# Altium schematic symbol library Wurth_Elektronik_Passive_rev16a.SCHLIB: 1143 symbols (part 13 of 27)
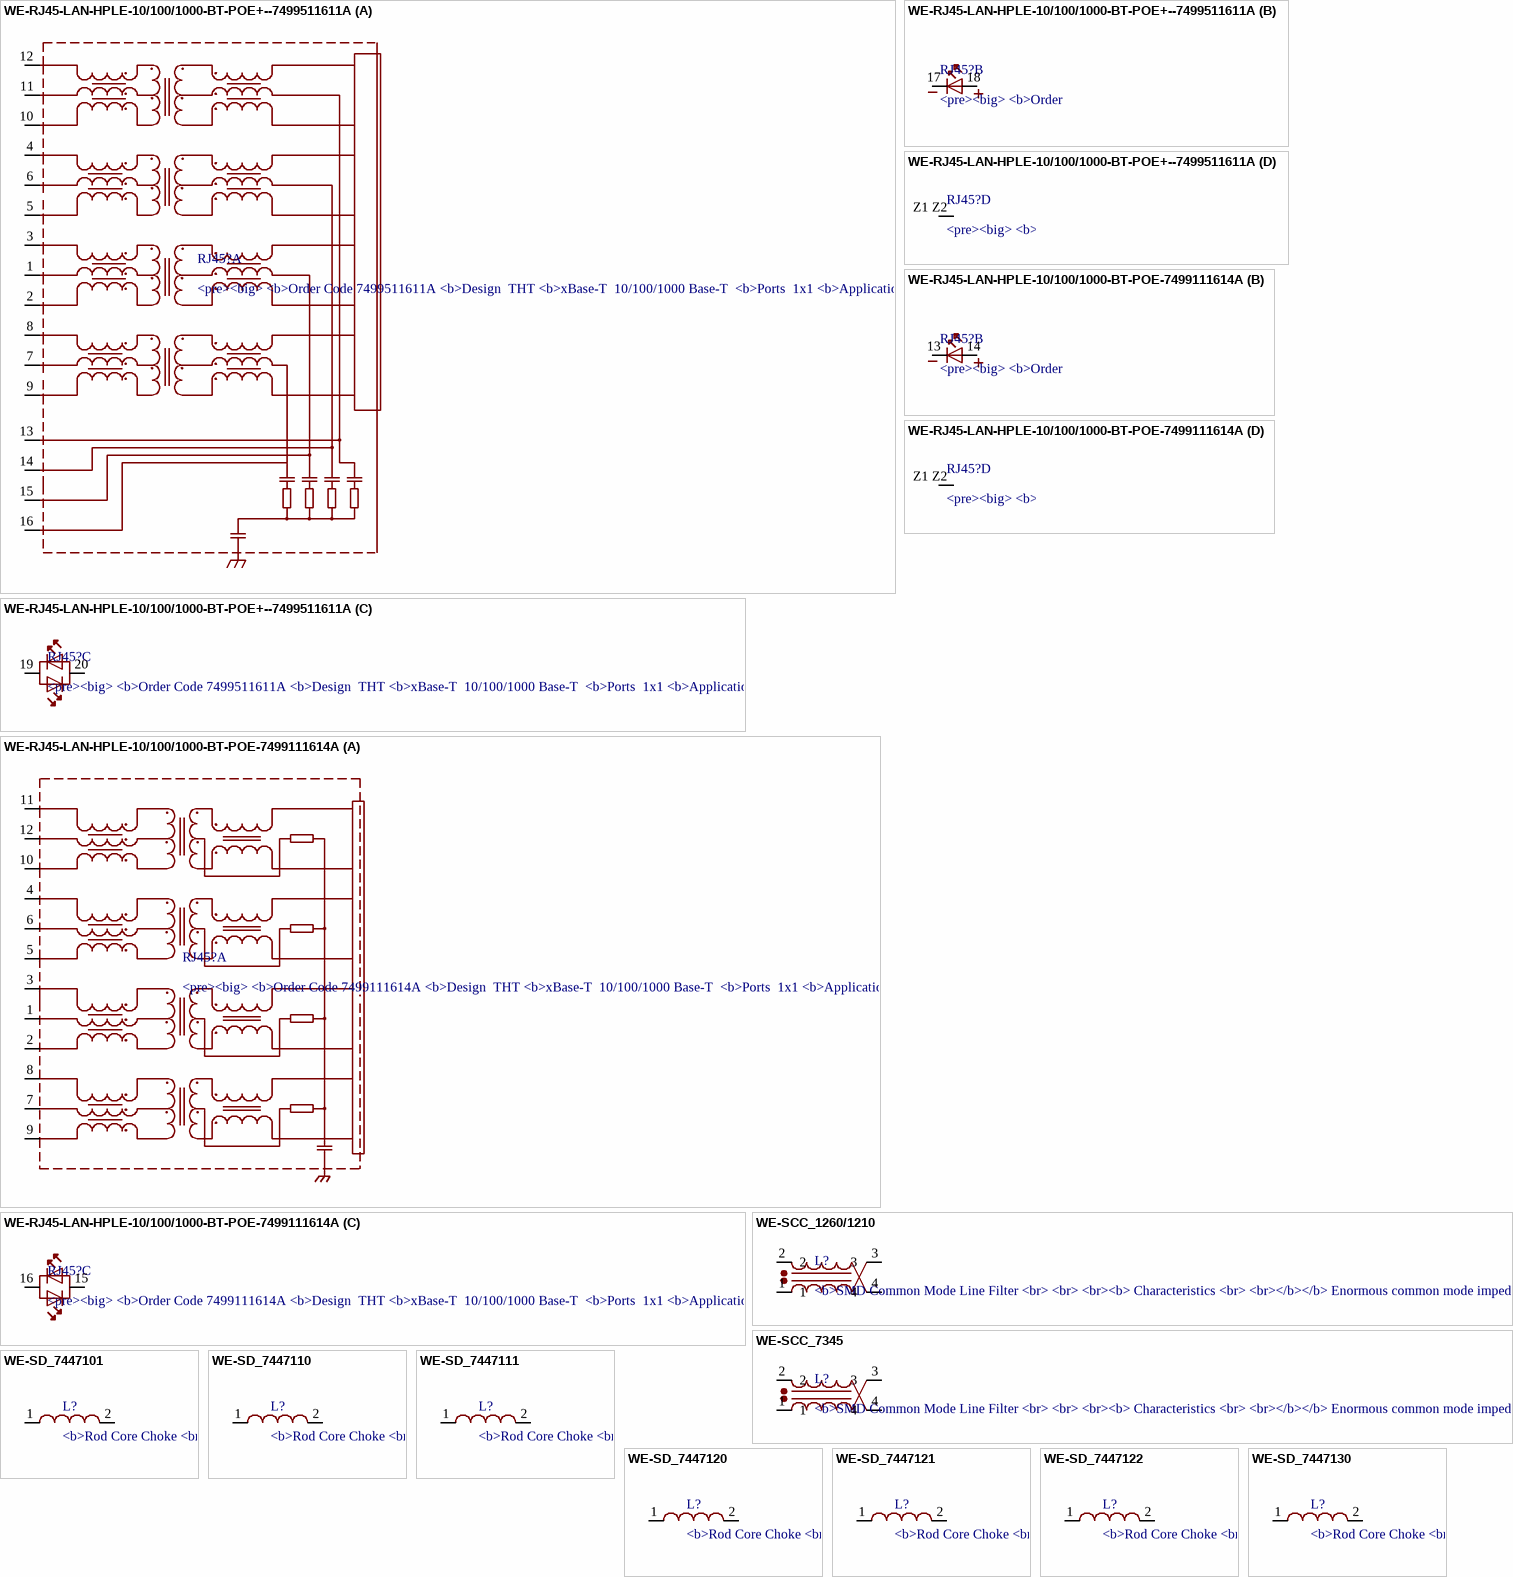
[diagram p70: symbols WE-RJ45-LAN-HPLE-10/100/1000-BT-POE+--7499511611A to WE-SD_7447130]

## WE-SD_7447101
designator L?, comment <b>Rod Core Choke / <br> / <br> / <br><b> Characteristics / <br> / <br></b></b> Rated current up to 15 A / <br> / <br> Inductance is independent from rated DC current / <br> / <br> High mechanical stability / <br> / <br> High saturation currents / <br> / <br> Operating temperature: –40 ºC to +150 ºC / <br> / <br> Custom designs on request / <br> / <br> / <br><b> Applications / <br> / <br></b> Switching regulators / <br> / <br> / <br> Motors / <br> / <br> Power amplifiers / <br> / <br> Power supplies / <br> / <br> Broadband filtering / <br> / <br> Typical in VHF / <br> / <br> / <br> / </b><br><a href=<br><a href="http://katalog.we-online.de/media/images/eisos/IndSD_pf2.jpg" title="Enlarge picture"> / <img src="http://katalog.we-online.de/media/images/eisos/IndSD_pf2.jpg" width="320"></a><p> / Details see: <a href="http://katalog.we-online.de/en/pbs/WE-SD?">http://katalog.we-online.de/en/pbs/WE-SD?</a><p> / </b> / </b>Updated  by  Dan Xu 2014-07-11<br> / </b>2014 (C) Wurth Elektronik
footprint WE-SD_7447101
pins: 1, 2

## WE-SD_7447110
designator L?, comment <b>Rod Core Choke / <br> / <br> / <br><b> Characteristics / <br> / <br></b></b> Rated current up to 15 A / <br> / <br> Inductance is independent from rated DC current / <br> / <br> High mechanical stability / <br> / <br> High saturation currents / <br> / <br> Operating temperature: –40 ºC to +150 ºC / <br> / <br> Custom designs on request / <br> / <br> / <br><b> Applications / <br> / <br></b> Switching regulators / <br> / <br> / <br> Motors / <br> / <br> Power amplifiers / <br> / <br> Power supplies / <br> / <br> Broadband filtering / <br> / <br> Typical in VHF / <br> / <br> / <br> / </b><br><a href=<br><a href="http://katalog.we-online.de/media/images/eisos/IndSD_pf2.jpg" title="Enlarge picture"> / <img src="http://katalog.we-online.de/media/images/eisos/IndSD_pf2.jpg" width="320"></a><p> / Details see: <a href="http://katalog.we-online.de/en/pbs/WE-SD?">http://katalog.we-online.de/en/pbs/WE-SD?</a><p> / </b> / </b>Updated  by  Dan Xu 2014-07-11<br> / </b>2014 (C) Wurth Elektronik
footprint WE-SD_7447110
pins: 1, 2

## WE-SD_7447111
designator L?, comment <b>Rod Core Choke / <br> / <br> / <br><b> Characteristics / <br> / <br></b></b> Rated current up to 15 A / <br> / <br> Inductance is independent from rated DC current / <br> / <br> High mechanical stability / <br> / <br> High saturation currents / <br> / <br> Operating temperature: –40 ºC to +150 ºC / <br> / <br> Custom designs on request / <br> / <br> / <br><b> Applications / <br> / <br></b> Switching regulators / <br> / <br> / <br> Motors / <br> / <br> Power amplifiers / <br> / <br> Power supplies / <br> / <br> Broadband filtering / <br> / <br> Typical in VHF / <br> / <br> / <br> / </b><br><a href=<br><a href="http://katalog.we-online.de/media/images/eisos/IndSD_pf2.jpg" title="Enlarge picture"> / <img src="http://katalog.we-online.de/media/images/eisos/IndSD_pf2.jpg" width="320"></a><p> / Details see: <a href="http://katalog.we-online.de/en/pbs/WE-SD?">http://katalog.we-online.de/en/pbs/WE-SD?</a><p> / </b> / </b>Updated  by  Dan Xu 2014-07-11<br> / </b>2014 (C) Wurth Elektronik
footprint WE-SD_7447111
pins: 1, 2

## WE-SD_7447120
designator L?, comment <b>Rod Core Choke / <br> / <br> / <br><b> Characteristics / <br> / <br></b></b> Rated current up to 15 A / <br> / <br> Inductance is independent from rated DC current / <br> / <br> High mechanical stability / <br> / <br> High saturation currents / <br> / <br> Operating temperature: –40 ºC to +150 ºC / <br> / <br> Custom designs on request / <br> / <br> / <br><b> Applications / <br> / <br></b> Switching regulators / <br> / <br> / <br> Motors / <br> / <br> Power amplifiers / <br> / <br> Power supplies / <br> / <br> Broadband filtering / <br> / <br> Typical in VHF / <br> / <br> / <br> / </b><br><a href=<br><a href="http://katalog.we-online.de/media/images/eisos/IndSD_pf2.jpg" title="Enlarge picture"> / <img src="http://katalog.we-online.de/media/images/eisos/IndSD_pf2.jpg" width="320"></a><p> / Details see: <a href="http://katalog.we-online.de/en/pbs/WE-SD?">http://katalog.we-online.de/en/pbs/WE-SD?</a><p> / </b> / </b>Updated  by  Dan Xu 2014-07-11<br> / </b>2014 (C) Wurth Elektronik
footprint WE-SD_7447120
pins: 1, 2

## WE-SD_7447121
designator L?, comment <b>Rod Core Choke / <br> / <br> / <br><b> Characteristics / <br> / <br></b></b> Rated current up to 15 A / <br> / <br> Inductance is independent from rated DC current / <br> / <br> High mechanical stability / <br> / <br> High saturation currents / <br> / <br> Operating temperature: –40 ºC to +150 ºC / <br> / <br> Custom designs on request / <br> / <br> / <br><b> Applications / <br> / <br></b> Switching regulators / <br> / <br> / <br> Motors / <br> / <br> Power amplifiers / <br> / <br> Power supplies / <br> / <br> Broadband filtering / <br> / <br> Typical in VHF / <br> / <br> / <br> / </b><br><a href=<br><a href="http://katalog.we-online.de/media/images/eisos/IndSD_pf2.jpg" title="Enlarge picture"> / <img src="http://katalog.we-online.de/media/images/eisos/IndSD_pf2.jpg" width="320"></a><p> / Details see: <a href="http://katalog.we-online.de/en/pbs/WE-SD?">http://katalog.we-online.de/en/pbs/WE-SD?</a><p> / </b> / </b>Updated  by  Dan Xu 2014-07-11<br> / </b>2014 (C) Wurth Elektronik
footprint WE-SD_7447121
pins: 1, 2

## WE-SD_7447122
designator L?, comment <b>Rod Core Choke / <br> / <br> / <br><b> Characteristics / <br> / <br></b></b> Rated current up to 15 A / <br> / <br> Inductance is independent from rated DC current / <br> / <br> High mechanical stability / <br> / <br> High saturation currents / <br> / <br> Operating temperature: –40 ºC to +150 ºC / <br> / <br> Custom designs on request / <br> / <br> / <br><b> Applications / <br> / <br></b> Switching regulators / <br> / <br> / <br> Motors / <br> / <br> Power amplifiers / <br> / <br> Power supplies / <br> / <br> Broadband filtering / <br> / <br> Typical in VHF / <br> / <br> / <br> / </b><br><a href=<br><a href="http://katalog.we-online.de/media/images/eisos/IndSD_pf2.jpg" title="Enlarge picture"> / <img src="http://katalog.we-online.de/media/images/eisos/IndSD_pf2.jpg" width="320"></a><p> / Details see: <a href="http://katalog.we-online.de/en/pbs/WE-SD?">http://katalog.we-online.de/en/pbs/WE-SD?</a><p> / </b> / </b>Updated  by  Dan Xu 2014-07-11<br> / </b>2014 (C) Wurth Elektronik
footprint WE-SD_7447122
pins: 1, 2

## WE-SD_7447130
designator L?, comment <b>Rod Core Choke / <br> / <br> / <br><b> Characteristics / <br> / <br></b></b> Rated current up to 15 A / <br> / <br> Inductance is independent from rated DC current / <br> / <br> High mechanical stability / <br> / <br> High saturation currents / <br> / <br> Operating temperature: –40 ºC to +150 ºC / <br> / <br> Custom designs on request / <br> / <br> / <br><b> Applications / <br> / <br></b> Switching regulators / <br> / <br> / <br> Motors / <br> / <br> Power amplifiers / <br> / <br> Power supplies / <br> / <br> Broadband filtering / <br> / <br> Typical in VHF / <br> / <br> / <br> / </b><br><a href=<br><a href="http://katalog.we-online.de/media/images/eisos/IndSD_pf2.jpg" title="Enlarge picture"> / <img src="http://katalog.we-online.de/media/images/eisos/IndSD_pf2.jpg" width="320"></a><p> / Details see: <a href="http://katalog.we-online.de/en/pbs/WE-SD?">http://katalog.we-online.de/en/pbs/WE-SD?</a><p> / </b> / </b>Updated  by  Dan Xu 2014-07-11<br> / </b>2014 (C) Wurth Elektronik
footprint WE-SD_7447130
pins: 1, 2

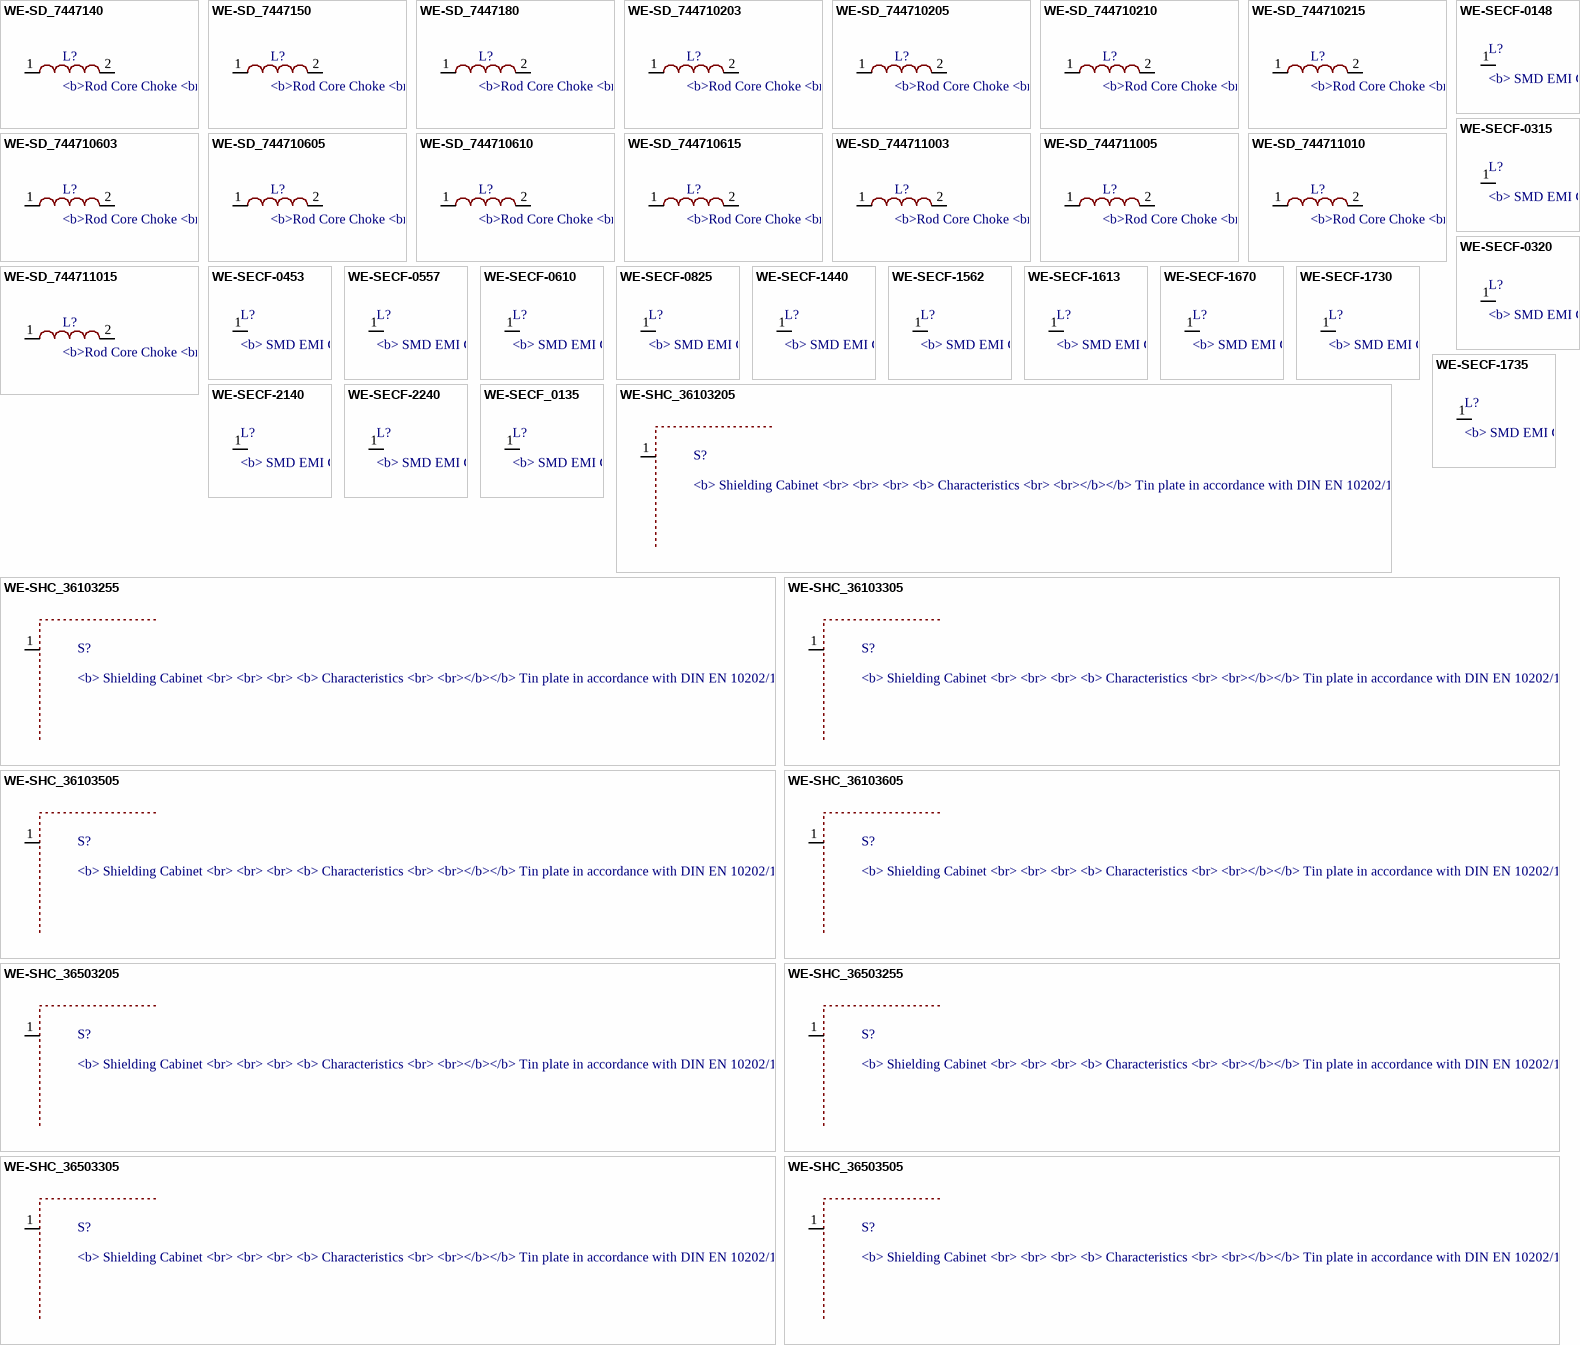
[diagram p42: symbols WE-SD_7447140 to WE-SHC_36503505]

## WE-SD_7447140
designator L?, comment <b>Rod Core Choke / <br> / <br> / <br><b> Characteristics / <br> / <br></b></b> Rated current up to 15 A / <br> / <br> Inductance is independent from rated DC current / <br> / <br> High mechanical stability / <br> / <br> High saturation currents / <br> / <br> Operating temperature: –40 ºC to +150 ºC / <br> / <br> Custom designs on request / <br> / <br> / <br><b> Applications / <br> / <br></b> Switching regulators / <br> / <br> / <br> Motors / <br> / <br> Power amplifiers / <br> / <br> Power supplies / <br> / <br> Broadband filtering / <br> / <br> Typical in VHF / <br> / <br> / <br> / </b><br><a href=<br><a href="http://katalog.we-online.de/media/images/eisos/IndSD_pf2.jpg" title="Enlarge picture"> / <img src="http://katalog.we-online.de/media/images/eisos/IndSD_pf2.jpg" width="320"></a><p> / Details see: <a href="http://katalog.we-online.de/en/pbs/WE-SD?">http://katalog.we-online.de/en/pbs/WE-SD?</a><p> / </b> / </b>Updated  by  Dan Xu 2014-07-11<br> / </b>2014 (C) Wurth Elektronik
footprint WE-SD_7447140
pins: 1, 2

## WE-SD_7447150
designator L?, comment <b>Rod Core Choke / <br> / <br> / <br><b> Characteristics / <br> / <br></b></b> Rated current up to 15 A / <br> / <br> Inductance is independent from rated DC current / <br> / <br> High mechanical stability / <br> / <br> High saturation currents / <br> / <br> Operating temperature: –40 ºC to +150 ºC / <br> / <br> Custom designs on request / <br> / <br> / <br><b> Applications / <br> / <br></b> Switching regulators / <br> / <br> / <br> Motors / <br> / <br> Power amplifiers / <br> / <br> Power supplies / <br> / <br> Broadband filtering / <br> / <br> Typical in VHF / <br> / <br> / <br> / </b><br><a href=<br><a href="http://katalog.we-online.de/media/images/eisos/IndSD_pf2.jpg" title="Enlarge picture"> / <img src="http://katalog.we-online.de/media/images/eisos/IndSD_pf2.jpg" width="320"></a><p> / Details see: <a href="http://katalog.we-online.de/en/pbs/WE-SD?">http://katalog.we-online.de/en/pbs/WE-SD?</a><p> / </b> / </b>Updated  by  Dan Xu 2014-07-11<br> / </b>2014 (C) Wurth Elektronik
footprint WE-SD_7447150
pins: 1, 2

## WE-SD_7447180
designator L?, comment <b>Rod Core Choke / <br> / <br> / <br><b> Characteristics / <br> / <br></b></b> Rated current up to 15 A / <br> / <br> Inductance is independent from rated DC current / <br> / <br> High mechanical stability / <br> / <br> High saturation currents / <br> / <br> Operating temperature: –40 ºC to +150 ºC / <br> / <br> Custom designs on request / <br> / <br> / <br><b> Applications / <br> / <br></b> Switching regulators / <br> / <br> / <br> Motors / <br> / <br> Power amplifiers / <br> / <br> Power supplies / <br> / <br> Broadband filtering / <br> / <br> Typical in VHF / <br> / <br> / <br> / </b><br><a href=<br><a href="http://katalog.we-online.de/media/images/eisos/IndSD_pf2.jpg" title="Enlarge picture"> / <img src="http://katalog.we-online.de/media/images/eisos/IndSD_pf2.jpg" width="320"></a><p> / Details see: <a href="http://katalog.we-online.de/en/pbs/WE-SD?">http://katalog.we-online.de/en/pbs/WE-SD?</a><p> / </b> / </b>Updated  by  Dan Xu 2014-07-11<br> / </b>2014 (C) Wurth Elektronik
footprint WE-SD_7447180
pins: 1, 2

## WE-SD_744710203
designator L?, comment <b>Rod Core Choke / <br> / <br> / <br><b> Characteristics / <br> / <br></b></b> Rated current up to 15 A / <br> / <br> Inductance is independent from rated DC current / <br> / <br> High mechanical stability / <br> / <br> High saturation currents / <br> / <br> Operating temperature: –40 ºC to +150 ºC / <br> / <br> Custom designs on request / <br> / <br> / <br><b> Applications / <br> / <br></b> Switching regulators / <br> / <br> / <br> Motors / <br> / <br> Power amplifiers / <br> / <br> Power supplies / <br> / <br> Broadband filtering / <br> / <br> Typical in VHF / <br> / <br> / <br> / </b><br><a href=<br><a href="http://katalog.we-online.de/media/images/eisos/IndSD_pf2.jpg" title="Enlarge picture"> / <img src="http://katalog.we-online.de/media/images/eisos/IndSD_pf2.jpg" width="320"></a><p> / Details see: <a href="http://katalog.we-online.de/en/pbs/WE-SD?">http://katalog.we-online.de/en/pbs/WE-SD?</a><p> / </b> / </b>Updated  by  Dan Xu 2014-07-11<br> / </b>2014 (C) Wurth Elektronik
footprint WE-SD_744710203
pins: 1, 2

## WE-SD_744710205
designator L?, comment <b>Rod Core Choke / <br> / <br> / <br><b> Characteristics / <br> / <br></b></b> Rated current up to 15 A / <br> / <br> Inductance is independent from rated DC current / <br> / <br> High mechanical stability / <br> / <br> High saturation currents / <br> / <br> Operating temperature: –40 ºC to +150 ºC / <br> / <br> Custom designs on request / <br> / <br> / <br><b> Applications / <br> / <br></b> Switching regulators / <br> / <br> / <br> Motors / <br> / <br> Power amplifiers / <br> / <br> Power supplies / <br> / <br> Broadband filtering / <br> / <br> Typical in VHF / <br> / <br> / <br> / </b><br><a href=<br><a href="http://katalog.we-online.de/media/images/eisos/IndSD_pf2.jpg" title="Enlarge picture"> / <img src="http://katalog.we-online.de/media/images/eisos/IndSD_pf2.jpg" width="320"></a><p> / Details see: <a href="http://katalog.we-online.de/en/pbs/WE-SD?">http://katalog.we-online.de/en/pbs/WE-SD?</a><p> / </b> / </b>Updated  by  Dan Xu 2014-07-11<br> / </b>2014 (C) Wurth Elektronik
footprint WE-SD_744710205
pins: 1, 2

## WE-SD_744710210
designator L?, comment <b>Rod Core Choke / <br> / <br> / <br><b> Characteristics / <br> / <br></b></b> Rated current up to 15 A / <br> / <br> Inductance is independent from rated DC current / <br> / <br> High mechanical stability / <br> / <br> High saturation currents / <br> / <br> Operating temperature: –40 ºC to +150 ºC / <br> / <br> Custom designs on request / <br> / <br> / <br><b> Applications / <br> / <br></b> Switching regulators / <br> / <br> / <br> Motors / <br> / <br> Power amplifiers / <br> / <br> Power supplies / <br> / <br> Broadband filtering / <br> / <br> Typical in VHF / <br> / <br> / <br> / </b><br><a href=<br><a href="http://katalog.we-online.de/media/images/eisos/IndSD_pf2.jpg" title="Enlarge picture"> / <img src="http://katalog.we-online.de/media/images/eisos/IndSD_pf2.jpg" width="320"></a><p> / Details see: <a href="http://katalog.we-online.de/en/pbs/WE-SD?">http://katalog.we-online.de/en/pbs/WE-SD?</a><p> / </b> / </b>Updated  by  Dan Xu 2014-07-11<br> / </b>2014 (C) Wurth Elektronik
footprint WE-SD_744710210
pins: 1, 2

## WE-SD_744710215
designator L?, comment <b>Rod Core Choke / <br> / <br> / <br><b> Characteristics / <br> / <br></b></b> Rated current up to 15 A / <br> / <br> Inductance is independent from rated DC current / <br> / <br> High mechanical stability / <br> / <br> High saturation currents / <br> / <br> Operating temperature: –40 ºC to +150 ºC / <br> / <br> Custom designs on request / <br> / <br> / <br><b> Applications / <br> / <br></b> Switching regulators / <br> / <br> / <br> Motors / <br> / <br> Power amplifiers / <br> / <br> Power supplies / <br> / <br> Broadband filtering / <br> / <br> Typical in VHF / <br> / <br> / <br> / </b><br><a href=<br><a href="http://katalog.we-online.de/media/images/eisos/IndSD_pf2.jpg" title="Enlarge picture"> / <img src="http://katalog.we-online.de/media/images/eisos/IndSD_pf2.jpg" width="320"></a><p> / Details see: <a href="http://katalog.we-online.de/en/pbs/WE-SD?">http://katalog.we-online.de/en/pbs/WE-SD?</a><p> / </b> / </b>Updated  by  Dan Xu 2014-07-11<br> / </b>2014 (C) Wurth Elektronik
footprint WE-SD_744710215
pins: 1, 2

## WE-SD_744710603
designator L?, comment <b>Rod Core Choke / <br> / <br> / <br><b> Characteristics / <br> / <br></b></b> Rated current up to 15 A / <br> / <br> Inductance is independent from rated DC current / <br> / <br> High mechanical stability / <br> / <br> High saturation currents / <br> / <br> Operating temperature: –40 ºC to +150 ºC / <br> / <br> Custom designs on request / <br> / <br> / <br><b> Applications / <br> / <br></b> Switching regulators / <br> / <br> / <br> Motors / <br> / <br> Power amplifiers / <br> / <br> Power supplies / <br> / <br> Broadband filtering / <br> / <br> Typical in VHF / <br> / <br> / <br> / </b><br><a href=<br><a href="http://katalog.we-online.de/media/images/eisos/IndSD_pf2.jpg" title="Enlarge picture"> / <img src="http://katalog.we-online.de/media/images/eisos/IndSD_pf2.jpg" width="320"></a><p> / Details see: <a href="http://katalog.we-online.de/en/pbs/WE-SD?">http://katalog.we-online.de/en/pbs/WE-SD?</a><p> / </b> / </b>Updated  by  Dan Xu 2014-07-11<br> / </b>2014 (C) Wurth Elektronik
footprint WE-SD_744710603
pins: 1, 2

## WE-SD_744710605
designator L?, comment <b>Rod Core Choke / <br> / <br> / <br><b> Characteristics / <br> / <br></b></b> Rated current up to 15 A / <br> / <br> Inductance is independent from rated DC current / <br> / <br> High mechanical stability / <br> / <br> High saturation currents / <br> / <br> Operating temperature: –40 ºC to +150 ºC / <br> / <br> Custom designs on request / <br> / <br> / <br><b> Applications / <br> / <br></b> Switching regulators / <br> / <br> / <br> Motors / <br> / <br> Power amplifiers / <br> / <br> Power supplies / <br> / <br> Broadband filtering / <br> / <br> Typical in VHF / <br> / <br> / <br> / </b><br><a href=<br><a href="http://katalog.we-online.de/media/images/eisos/IndSD_pf2.jpg" title="Enlarge picture"> / <img src="http://katalog.we-online.de/media/images/eisos/IndSD_pf2.jpg" width="320"></a><p> / Details see: <a href="http://katalog.we-online.de/en/pbs/WE-SD?">http://katalog.we-online.de/en/pbs/WE-SD?</a><p> / </b> / </b>Updated  by  Dan Xu 2014-07-11<br> / </b>2014 (C) Wurth Elektronik
footprint WE-SD_744710605
pins: 1, 2

## WE-SD_744710610
designator L?, comment <b>Rod Core Choke / <br> / <br> / <br><b> Characteristics / <br> / <br></b></b> Rated current up to 15 A / <br> / <br> Inductance is independent from rated DC current / <br> / <br> High mechanical stability / <br> / <br> High saturation currents / <br> / <br> Operating temperature: –40 ºC to +150 ºC / <br> / <br> Custom designs on request / <br> / <br> / <br><b> Applications / <br> / <br></b> Switching regulators / <br> / <br> / <br> Motors / <br> / <br> Power amplifiers / <br> / <br> Power supplies / <br> / <br> Broadband filtering / <br> / <br> Typical in VHF / <br> / <br> / <br> / </b><br><a href=<br><a href="http://katalog.we-online.de/media/images/eisos/IndSD_pf2.jpg" title="Enlarge picture"> / <img src="http://katalog.we-online.de/media/images/eisos/IndSD_pf2.jpg" width="320"></a><p> / Details see: <a href="http://katalog.we-online.de/en/pbs/WE-SD?">http://katalog.we-online.de/en/pbs/WE-SD?</a><p> / </b> / </b>Updated  by  Dan Xu 2014-07-11<br> / </b>2014 (C) Wurth Elektronik
footprint WE-SD_744710610
pins: 1, 2

## WE-SD_744710615
designator L?, comment <b>Rod Core Choke / <br> / <br> / <br><b> Characteristics / <br> / <br></b></b> Rated current up to 15 A / <br> / <br> Inductance is independent from rated DC current / <br> / <br> High mechanical stability / <br> / <br> High saturation currents / <br> / <br> Operating temperature: –40 ºC to +150 ºC / <br> / <br> Custom designs on request / <br> / <br> / <br><b> Applications / <br> / <br></b> Switching regulators / <br> / <br> / <br> Motors / <br> / <br> Power amplifiers / <br> / <br> Power supplies / <br> / <br> Broadband filtering / <br> / <br> Typical in VHF / <br> / <br> / <br> / </b><br><a href=<br><a href="http://katalog.we-online.de/media/images/eisos/IndSD_pf2.jpg" title="Enlarge picture"> / <img src="http://katalog.we-online.de/media/images/eisos/IndSD_pf2.jpg" width="320"></a><p> / Details see: <a href="http://katalog.we-online.de/en/pbs/WE-SD?">http://katalog.we-online.de/en/pbs/WE-SD?</a><p> / </b> / </b>Updated  by  Dan Xu 2014-07-11<br> / </b>2014 (C) Wurth Elektronik
footprint WE-SD_744710615
pins: 1, 2

## WE-SD_744711003
designator L?, comment <b>Rod Core Choke / <br> / <br> / <br><b> Characteristics / <br> / <br></b></b> Rated current up to 15 A / <br> / <br> Inductance is independent from rated DC current / <br> / <br> High mechanical stability / <br> / <br> High saturation currents / <br> / <br> Operating temperature: –40 ºC to +150 ºC / <br> / <br> Custom designs on request / <br> / <br> / <br><b> Applications / <br> / <br></b> Switching regulators / <br> / <br> / <br> Motors / <br> / <br> Power amplifiers / <br> / <br> Power supplies / <br> / <br> Broadband filtering / <br> / <br> Typical in VHF / <br> / <br> / <br> / </b><br><a href=<br><a href="http://katalog.we-online.de/media/images/eisos/IndSD_pf2.jpg" title="Enlarge picture"> / <img src="http://katalog.we-online.de/media/images/eisos/IndSD_pf2.jpg" width="320"></a><p> / Details see: <a href="http://katalog.we-online.de/en/pbs/WE-SD?">http://katalog.we-online.de/en/pbs/WE-SD?</a><p> / </b> / </b>Updated  by  Dan Xu 2014-07-11<br> / </b>2014 (C) Wurth Elektronik
footprint WE-SD_744711003
pins: 1, 2

## WE-SD_744711005
designator L?, comment <b>Rod Core Choke / <br> / <br> / <br><b> Characteristics / <br> / <br></b></b> Rated current up to 15 A / <br> / <br> Inductance is independent from rated DC current / <br> / <br> High mechanical stability / <br> / <br> High saturation currents / <br> / <br> Operating temperature: –40 ºC to +150 ºC / <br> / <br> Custom designs on request / <br> / <br> / <br><b> Applications / <br> / <br></b> Switching regulators / <br> / <br> / <br> Motors / <br> / <br> Power amplifiers / <br> / <br> Power supplies / <br> / <br> Broadband filtering / <br> / <br> Typical in VHF / <br> / <br> / <br> / </b><br><a href=<br><a href="http://katalog.we-online.de/media/images/eisos/IndSD_pf2.jpg" title="Enlarge picture"> / <img src="http://katalog.we-online.de/media/images/eisos/IndSD_pf2.jpg" width="320"></a><p> / Details see: <a href="http://katalog.we-online.de/en/pbs/WE-SD?">http://katalog.we-online.de/en/pbs/WE-SD?</a><p> / </b> / </b>Updated  by  Dan Xu 2014-07-11<br> / </b>2014 (C) Wurth Elektronik
footprint WE-SD_744711005
pins: 1, 2

## WE-SD_744711010
designator L?, comment <b>Rod Core Choke / <br> / <br> / <br><b> Characteristics / <br> / <br></b></b> Rated current up to 15 A / <br> / <br> Inductance is independent from rated DC current / <br> / <br> High mechanical stability / <br> / <br> High saturation currents / <br> / <br> Operating temperature: –40 ºC to +150 ºC / <br> / <br> Custom designs on request / <br> / <br> / <br><b> Applications / <br> / <br></b> Switching regulators / <br> / <br> / <br> Motors / <br> / <br> Power amplifiers / <br> / <br> Power supplies / <br> / <br> Broadband filtering / <br> / <br> Typical in VHF / <br> / <br> / <br> / </b><br><a href=<br><a href="http://katalog.we-online.de/media/images/eisos/IndSD_pf2.jpg" title="Enlarge picture"> / <img src="http://katalog.we-online.de/media/images/eisos/IndSD_pf2.jpg" width="320"></a><p> / Details see: <a href="http://katalog.we-online.de/en/pbs/WE-SD?">http://katalog.we-online.de/en/pbs/WE-SD?</a><p> / </b> / </b>Updated  by  Dan Xu 2014-07-11<br> / </b>2014 (C) Wurth Elektronik
footprint WE-SD_744711010
pins: 1, 2

## WE-SD_744711015
designator L?, comment <b>Rod Core Choke / <br> / <br> / <br><b> Characteristics / <br> / <br></b></b> Rated current up to 15 A / <br> / <br> Inductance is independent from rated DC current / <br> / <br> High mechanical stability / <br> / <br> High saturation currents / <br> / <br> Operating temperature: –40 ºC to +150 ºC / <br> / <br> Custom designs on request / <br> / <br> / <br><b> Applications / <br> / <br></b> Switching regulators / <br> / <br> / <br> Motors / <br> / <br> Power amplifiers / <br> / <br> Power supplies / <br> / <br> Broadband filtering / <br> / <br> Typical in VHF / <br> / <br> / <br> / </b><br><a href=<br><a href="http://katalog.we-online.de/media/images/eisos/IndSD_pf2.jpg" title="Enlarge picture"> / <img src="http://katalog.we-online.de/media/images/eisos/IndSD_pf2.jpg" width="320"></a><p> / Details see: <a href="http://katalog.we-online.de/en/pbs/WE-SD?">http://katalog.we-online.de/en/pbs/WE-SD?</a><p> / </b> / </b>Updated  by  Dan Xu 2014-07-11<br> / </b>2014 (C) Wurth Elektronik
footprint WE-SD_744711015
pins: 1, 2

## WE-SECF-0148
designator L?, comment <b> SMD EMI Contact Finger / <br> / <br> / <br><b> Characteristics / <br> / <br></b></b> Material: Copper Beryllium (CuBe) gold-plated (AU) / <br> / <br> Corrosion resistant / <br> / <br> Wear resistant / <br> / <br> High temperatures and mechanical weight have no influence on the excellent connection properties / <br> / <br> Reliable solderability / <br> / <br> Tape & reel packaging / <br> / <br> Perfectly suited for automated placement / <br> / <br> Different types and sizes available / <br> / <br> / <br><b> Applications / <br> / <br></b> Contact between PCB's ground and housing / <br> / <br> Low impedance RF connection between PCBs and/or PCB and metal case / <br> / <br> / </b><br><a href="<br><a href="http://katalog.we-online.de/media/images/eisos/AbsSESF_pf2.jpg" title="Enlarge picture"> / <img src="http://katalog.we-online.de/media/images/eisos/AbsSESF_pf2.jpg" width="320"></a><p> / Details see: <a href="http://katalog.we-online.de/en/pbs/WE-SECF?">http://katalog.we-online.de/en/pbs/WE-SECF?</a><p> / </b> / </b>Updated  by  Dan Xu 2014-07-15<br> / </b>2014 (C) Wurth Elektronik
MANUFACTURER: Würth Elektronik eiSos GmbH; CREATED-BY: Christin Otto; COMPANY-URL: http://www.we-online.de; CREATED-DATE: MAR 2013; DATASHEET-URL: http://katalog.we-online.de/pbs/datasheet/331011452048.pdf
footprint WE-SECF_0148
pins: 1 P$1 (power)

## WE-SECF-0315
designator L?, comment <b> SMD EMI Contact Finger / <br> / <br> / <br><b> Characteristics / <br> / <br></b></b> Material: Copper Beryllium (CuBe) gold-plated (AU) / <br> / <br> Corrosion resistant / <br> / <br> Wear resistant / <br> / <br> High temperatures and mechanical weight have no influence on the excellent connection properties / <br> / <br> Reliable solderability / <br> / <br> Tape & reel packaging / <br> / <br> Perfectly suited for automated placement / <br> / <br> Different types and sizes available / <br> / <br> / <br><b> Applications / <br> / <br></b> Contact between PCB's ground and housing / <br> / <br> Low impedance RF connection between PCBs and/or PCB and metal case / <br> / <br> / </b><br><a href="<br><a href="http://katalog.we-online.de/media/images/eisos/AbsSESF_pf2.jpg" title="Enlarge picture"> / <img src="http://katalog.we-online.de/media/images/eisos/AbsSESF_pf2.jpg" width="320"></a><p> / Details see: <a href="http://katalog.we-online.de/en/pbs/WE-SECF?">http://katalog.we-online.de/en/pbs/WE-SECF?</a><p> / </b> / </b>Updated  by  Dan Xu 2014-07-15<br> / </b>2014 (C) Wurth Elektronik
MANUFACTURER: Würth Elektronik eiSos GmbH; CREATED-BY: Christin Otto; COMPANY-URL: http://www.we-online.de; CREATED-DATE: MAR 2013; DATASHEET-URL: http://katalog.we-online.de/pbs/datasheet/331031321515.pdf
footprint WE-SECF_0315
pins: 1 P$1 (power)

## WE-SECF-0320
designator L?, comment <b> SMD EMI Contact Finger / <br> / <br> / <br><b> Characteristics / <br> / <br></b></b> Material: Copper Beryllium (CuBe) gold-plated (AU) / <br> / <br> Corrosion resistant / <br> / <br> Wear resistant / <br> / <br> High temperatures and mechanical weight have no influence on the excellent connection properties / <br> / <br> Reliable solderability / <br> / <br> Tape & reel packaging / <br> / <br> Perfectly suited for automated placement / <br> / <br> Different types and sizes available / <br> / <br> / <br><b> Applications / <br> / <br></b> Contact between PCB's ground and housing / <br> / <br> Low impedance RF connection between PCBs and/or PCB and metal case / <br> / <br> / </b><br><a href="<br><a href="http://katalog.we-online.de/media/images/eisos/AbsSESF_pf2.jpg" title="Enlarge picture"> / <img src="http://katalog.we-online.de/media/images/eisos/AbsSESF_pf2.jpg" width="320"></a><p> / Details see: <a href="http://katalog.we-online.de/en/pbs/WE-SECF?">http://katalog.we-online.de/en/pbs/WE-SECF?</a><p> / </b> / </b>Updated  by  Dan Xu 2014-07-15<br> / </b>2014 (C) Wurth Elektronik
MANUFACTURER: Würth Elektronik eiSos GmbH; CREATED-BY: Christin Otto; COMPANY-URL: http://www.we-online.de; CREATED-DATE: MAR 2013; DATASHEET-URL: http://katalog.we-online.de/pbs/datasheet/331031271520.pdf
footprint WE-SECF_0320
pins: 1 P$1 (power)

## WE-SECF-0453
designator L?, comment <b> SMD EMI Contact Finger / <br> / <br> / <br><b> Characteristics / <br> / <br></b></b> Material: Copper Beryllium (CuBe) gold-plated (AU) / <br> / <br> Corrosion resistant / <br> / <br> Wear resistant / <br> / <br> High temperatures and mechanical weight have no influence on the excellent connection properties / <br> / <br> Reliable solderability / <br> / <br> Tape & reel packaging / <br> / <br> Perfectly suited for automated placement / <br> / <br> Different types and sizes available / <br> / <br> / <br><b> Applications / <br> / <br></b> Contact between PCB's ground and housing / <br> / <br> Low impedance RF connection between PCBs and/or PCB and metal case / <br> / <br> / </b><br><a href="<br><a href="http://katalog.we-online.de/media/images/eisos/AbsSESF_pf2.jpg" title="Enlarge picture"> / <img src="http://katalog.we-online.de/media/images/eisos/AbsSESF_pf2.jpg" width="320"></a><p> / Details see: <a href="http://katalog.we-online.de/en/pbs/WE-SECF?">http://katalog.we-online.de/en/pbs/WE-SECF?</a><p> / </b> / </b>Updated  by  Dan Xu 2014-07-15<br> / </b>2014 (C) Wurth Elektronik
MANUFACTURER: Würth Elektronik eiSos GmbH; CREATED-BY: Christin Otto; COMPANY-URL: http://www.we-online.de; CREATED-DATE: MAR 2013; DATASHEET-URL: http://katalog.we-online.de/pbs/datasheet/331041402053.pdf
footprint WE-SECF_0453
pins: 1 P$1 (power)

## WE-SECF-0557
designator L?, comment <b> SMD EMI Contact Finger / <br> / <br> / <br><b> Characteristics / <br> / <br></b></b> Material: Copper Beryllium (CuBe) gold-plated (AU) / <br> / <br> Corrosion resistant / <br> / <br> Wear resistant / <br> / <br> High temperatures and mechanical weight have no influence on the excellent connection properties / <br> / <br> Reliable solderability / <br> / <br> Tape & reel packaging / <br> / <br> Perfectly suited for automated placement / <br> / <br> Different types and sizes available / <br> / <br> / <br><b> Applications / <br> / <br></b> Contact between PCB's ground and housing / <br> / <br> Low impedance RF connection between PCBs and/or PCB and metal case / <br> / <br> / </b><br><a href="<br><a href="http://katalog.we-online.de/media/images/eisos/AbsSESF_pf2.jpg" title="Enlarge picture"> / <img src="http://katalog.we-online.de/media/images/eisos/AbsSESF_pf2.jpg" width="320"></a><p> / Details see: <a href="http://katalog.we-online.de/en/pbs/WE-SECF?">http://katalog.we-online.de/en/pbs/WE-SECF?</a><p> / </b> / </b>Updated  by  Dan Xu 2014-07-15<br> / </b>2014 (C) Wurth Elektronik
MANUFACTURER: Würth Elektronik eiSos GmbH; CREATED-BY: Christin Otto; COMPANY-URL: http://www.we-online.de; CREATED-DATE: MAR 2013; DATASHEET-URL: http://katalog.we-online.de/pbs/datasheet/331051472057.pdf
footprint WE-SECF-0557
pins: 1 P$1 (power)

## WE-SECF-0610
designator L?, comment <b> SMD EMI Contact Finger / <br> / <br> / <br><b> Characteristics / <br> / <br></b></b> Material: Copper Beryllium (CuBe) gold-plated (AU) / <br> / <br> Corrosion resistant / <br> / <br> Wear resistant / <br> / <br> High temperatures and mechanical weight have no influence on the excellent connection properties / <br> / <br> Reliable solderability / <br> / <br> Tape & reel packaging / <br> / <br> Perfectly suited for automated placement / <br> / <br> Different types and sizes available / <br> / <br> / <br><b> Applications / <br> / <br></b> Contact between PCB's ground and housing / <br> / <br> Low impedance RF connection between PCBs and/or PCB and metal case / <br> / <br> / </b><br><a href="<br><a href="http://katalog.we-online.de/media/images/eisos/AbsSESF_pf2.jpg" title="Enlarge picture"> / <img src="http://katalog.we-online.de/media/images/eisos/AbsSESF_pf2.jpg" width="320"></a><p> / Details see: <a href="http://katalog.we-online.de/en/pbs/WE-SECF?">http://katalog.we-online.de/en/pbs/WE-SECF?</a><p> / </b> / </b>Updated  by  Dan Xu 2014-07-15<br> / </b>2014 (C) Wurth Elektronik
MANUFACTURER: Würth Elektronik eiSos GmbH; CREATED-BY: Christin Otto; COMPANY-URL: http://www.we-online.de; CREATED-DATE: MAR 2013; DATASHEET-URL: http://katalog.we-online.de/pbs/datasheet/331061603010.pdf
footprint WE-SECF_0610
pins: 1 P$1 (power)

## WE-SECF-0825
designator L?, comment <b> SMD EMI Contact Finger / <br> / <br> / <br><b> Characteristics / <br> / <br></b></b> Material: Copper Beryllium (CuBe) gold-plated (AU) / <br> / <br> Corrosion resistant / <br> / <br> Wear resistant / <br> / <br> High temperatures and mechanical weight have no influence on the excellent connection properties / <br> / <br> Reliable solderability / <br> / <br> Tape & reel packaging / <br> / <br> Perfectly suited for automated placement / <br> / <br> Different types and sizes available / <br> / <br> / <br><b> Applications / <br> / <br></b> Contact between PCB's ground and housing / <br> / <br> Low impedance RF connection between PCBs and/or PCB and metal case / <br> / <br> / </b><br><a href="<br><a href="http://katalog.we-online.de/media/images/eisos/AbsSESF_pf2.jpg" title="Enlarge picture"> / <img src="http://katalog.we-online.de/media/images/eisos/AbsSESF_pf2.jpg" width="320"></a><p> / Details see: <a href="http://katalog.we-online.de/en/pbs/WE-SECF?">http://katalog.we-online.de/en/pbs/WE-SECF?</a><p> / </b> / </b>Updated  by  Dan Xu 2014-07-15<br> / </b>2014 (C) Wurth Elektronik
MANUFACTURER: Würth Elektronik eiSos GmbH; CREATED-BY: Christin Otto; COMPANY-URL: http://www.we-online.de; CREATED-DATE: MAR 2013; DATASHEET-URL: http://katalog.we-online.de/pbs/datasheet/331081302025.pdf
footprint WE-SECF_0825
pins: 1 P$1 (power)

## WE-SECF-1440
designator L?, comment <b> SMD EMI Contact Finger / <br> / <br> / <br><b> Characteristics / <br> / <br></b></b> Material: Copper Beryllium (CuBe) gold-plated (AU) / <br> / <br> Corrosion resistant / <br> / <br> Wear resistant / <br> / <br> High temperatures and mechanical weight have no influence on the excellent connection properties / <br> / <br> Reliable solderability / <br> / <br> Tape & reel packaging / <br> / <br> Perfectly suited for automated placement / <br> / <br> Different types and sizes available / <br> / <br> / <br><b> Applications / <br> / <br></b> Contact between PCB's ground and housing / <br> / <br> Low impedance RF connection between PCBs and/or PCB and metal case / <br> / <br> / </b><br><a href="<br><a href="http://katalog.we-online.de/media/images/eisos/AbsSESF_pf2.jpg" title="Enlarge picture"> / <img src="http://katalog.we-online.de/media/images/eisos/AbsSESF_pf2.jpg" width="320"></a><p> / Details see: <a href="http://katalog.we-online.de/en/pbs/WE-SECF?">http://katalog.we-online.de/en/pbs/WE-SECF?</a><p> / </b> / </b>Updated  by  Dan Xu 2014-07-15<br> / </b>2014 (C) Wurth Elektronik
MANUFACTURER: Würth Elektronik eiSos GmbH; CREATED-BY: Christin Otto; COMPANY-URL: http://www.we-online.de; CREATED-DATE: MAR 2013; DATASHEET-URL: http://katalog.we-online.de/pbs/datasheet/331141352540.pdf
footprint WE-SECF_1440
pins: 1 P$1 (power)

## WE-SECF-1562
designator L?, comment <b> SMD EMI Contact Finger / <br> / <br> / <br><b> Characteristics / <br> / <br></b></b> Material: Copper Beryllium (CuBe) gold-plated (AU) / <br> / <br> Corrosion resistant / <br> / <br> Wear resistant / <br> / <br> High temperatures and mechanical weight have no influence on the excellent connection properties / <br> / <br> Reliable solderability / <br> / <br> Tape & reel packaging / <br> / <br> Perfectly suited for automated placement / <br> / <br> Different types and sizes available / <br> / <br> / <br><b> Applications / <br> / <br></b> Contact between PCB's ground and housing / <br> / <br> Low impedance RF connection between PCBs and/or PCB and metal case / <br> / <br> / </b><br><a href="<br><a href="http://katalog.we-online.de/media/images/eisos/AbsSESF_pf2.jpg" title="Enlarge picture"> / <img src="http://katalog.we-online.de/media/images/eisos/AbsSESF_pf2.jpg" width="320"></a><p> / Details see: <a href="http://katalog.we-online.de/en/pbs/WE-SECF?">http://katalog.we-online.de/en/pbs/WE-SECF?</a><p> / </b> / </b>Updated  by  Dan Xu 2014-07-15<br> / </b>2014 (C) Wurth Elektronik
MANUFACTURER: Würth Elektronik eiSos GmbH; CREATED-BY: Christin Otto; COMPANY-URL: http://www.we-online.de; CREATED-DATE: MAR 2013; DATASHEET-URL: http://katalog.we-online.de/pbs/datasheet/331151702562.pdf
footprint WE-SECF-1562
pins: 1 P$1 (power)

## WE-SECF-1613
designator L?, comment <b> SMD EMI Contact Finger / <br> / <br> / <br><b> Characteristics / <br> / <br></b></b> Material: Copper Beryllium (CuBe) gold-plated (AU) / <br> / <br> Corrosion resistant / <br> / <br> Wear resistant / <br> / <br> High temperatures and mechanical weight have no influence on the excellent connection properties / <br> / <br> Reliable solderability / <br> / <br> Tape & reel packaging / <br> / <br> Perfectly suited for automated placement / <br> / <br> Different types and sizes available / <br> / <br> / <br><b> Applications / <br> / <br></b> Contact between PCB's ground and housing / <br> / <br> Low impedance RF connection between PCBs and/or PCB and metal case / <br> / <br> / </b><br><a href="<br><a href="http://katalog.we-online.de/media/images/eisos/AbsSESF_pf2.jpg" title="Enlarge picture"> / <img src="http://katalog.we-online.de/media/images/eisos/AbsSESF_pf2.jpg" width="320"></a><p> / Details see: <a href="http://katalog.we-online.de/en/pbs/WE-SECF?">http://katalog.we-online.de/en/pbs/WE-SECF?</a><p> / </b> / </b>Updated  by  Dan Xu 2014-07-15<br> / </b>2014 (C) Wurth Elektronik
MANUFACTURER: Würth Elektronik eiSos GmbH; CREATED-BY: Christin Otto; COMPANY-URL: http://www.we-online.de; CREATED-DATE: MAR 2013; DATASHEET-URL: http://katalog.we-online.de/pbs/datasheet/331161702513.pdf
footprint WE-SECF_1613
pins: 1 P$1 (power)

## WE-SECF-1670
designator L?, comment <b> SMD EMI Contact Finger / <br> / <br> / <br><b> Characteristics / <br> / <br></b></b> Material: Copper Beryllium (CuBe) gold-plated (AU) / <br> / <br> Corrosion resistant / <br> / <br> Wear resistant / <br> / <br> High temperatures and mechanical weight have no influence on the excellent connection properties / <br> / <br> Reliable solderability / <br> / <br> Tape & reel packaging / <br> / <br> Perfectly suited for automated placement / <br> / <br> Different types and sizes available / <br> / <br> / <br><b> Applications / <br> / <br></b> Contact between PCB's ground and housing / <br> / <br> Low impedance RF connection between PCBs and/or PCB and metal case / <br> / <br> / </b><br><a href="<br><a href="http://katalog.we-online.de/media/images/eisos/AbsSESF_pf2.jpg" title="Enlarge picture"> / <img src="http://katalog.we-online.de/media/images/eisos/AbsSESF_pf2.jpg" width="320"></a><p> / Details see: <a href="http://katalog.we-online.de/en/pbs/WE-SECF?">http://katalog.we-online.de/en/pbs/WE-SECF?</a><p> / </b> / </b>Updated  by  Dan Xu 2014-07-15<br> / </b>2014 (C) Wurth Elektronik
MANUFACTURER: Würth Elektronik eiSos GmbH; CREATED-BY: Christin Otto; COMPANY-URL: http://www.we-online.de; CREATED-DATE: MAR 2013; DATASHEET-URL: http://katalog.we-online.de/pbs/datasheet/331161452070.pdf
footprint WE-SECF_1670
pins: 1 P$1 (power)

## WE-SECF-1730
designator L?, comment <b> SMD EMI Contact Finger / <br> / <br> / <br><b> Characteristics / <br> / <br></b></b> Material: Copper Beryllium (CuBe) gold-plated (AU) / <br> / <br> Corrosion resistant / <br> / <br> Wear resistant / <br> / <br> High temperatures and mechanical weight have no influence on the excellent connection properties / <br> / <br> Reliable solderability / <br> / <br> Tape & reel packaging / <br> / <br> Perfectly suited for automated placement / <br> / <br> Different types and sizes available / <br> / <br> / <br><b> Applications / <br> / <br></b> Contact between PCB's ground and housing / <br> / <br> Low impedance RF connection between PCBs and/or PCB and metal case / <br> / <br> / </b><br><a href="<br><a href="http://katalog.we-online.de/media/images/eisos/AbsSESF_pf2.jpg" title="Enlarge picture"> / <img src="http://katalog.we-online.de/media/images/eisos/AbsSESF_pf2.jpg" width="320"></a><p> / Details see: <a href="http://katalog.we-online.de/en/pbs/WE-SECF?">http://katalog.we-online.de/en/pbs/WE-SECF?</a><p> / </b> / </b>Updated  by  Dan Xu 2014-07-15<br> / </b>2014 (C) Wurth Elektronik
MANUFACTURER: Würth Elektronik eiSos GmbH; CREATED-BY: Christin Otto; COMPANY-URL: http://www.we-online.de; CREATED-DATE: MAR 2013; DATASHEET-URL: http://katalog.we-online.de/pbs/datasheet/331171302030.pdf
footprint WE-SECF_1730
pins: 1 P$1 (power)

## WE-SECF-1735
designator L?, comment <b> SMD EMI Contact Finger / <br> / <br> / <br><b> Characteristics / <br> / <br></b></b> Material: Copper Beryllium (CuBe) gold-plated (AU) / <br> / <br> Corrosion resistant / <br> / <br> Wear resistant / <br> / <br> High temperatures and mechanical weight have no influence on the excellent connection properties / <br> / <br> Reliable solderability / <br> / <br> Tape & reel packaging / <br> / <br> Perfectly suited for automated placement / <br> / <br> Different types and sizes available / <br> / <br> / <br><b> Applications / <br> / <br></b> Contact between PCB's ground and housing / <br> / <br> Low impedance RF connection between PCBs and/or PCB and metal case / <br> / <br> / </b><br><a href="<br><a href="http://katalog.we-online.de/media/images/eisos/AbsSESF_pf2.jpg" title="Enlarge picture"> / <img src="http://katalog.we-online.de/media/images/eisos/AbsSESF_pf2.jpg" width="320"></a><p> / Details see: <a href="http://katalog.we-online.de/en/pbs/WE-SECF?">http://katalog.we-online.de/en/pbs/WE-SECF?</a><p> / </b> / </b>Updated  by  Dan Xu 2014-07-15<br> / </b>2014 (C) Wurth Elektronik
MANUFACTURER: Würth Elektronik eiSos GmbH; CREATED-BY: Christin Otto; COMPANY-URL: http://www.we-online.de; CREATED-DATE: MAR 2013; DATASHEET-URL: http://katalog.we-online.de/pbs/datasheet/331171302035.pdf
footprint WE-SECF_1735
pins: 1 P$1 (power)

## WE-SECF-2140
designator L?, comment <b> SMD EMI Contact Finger / <br> / <br> / <br><b> Characteristics / <br> / <br></b></b> Material: Copper Beryllium (CuBe) gold-plated (AU) / <br> / <br> Corrosion resistant / <br> / <br> Wear resistant / <br> / <br> High temperatures and mechanical weight have no influence on the excellent connection properties / <br> / <br> Reliable solderability / <br> / <br> Tape & reel packaging / <br> / <br> Perfectly suited for automated placement / <br> / <br> Different types and sizes available / <br> / <br> / <br><b> Applications / <br> / <br></b> Contact between PCB's ground and housing / <br> / <br> Low impedance RF connection between PCBs and/or PCB and metal case / <br> / <br> / </b><br><a href="<br><a href="http://katalog.we-online.de/media/images/eisos/AbsSESF_pf2.jpg" title="Enlarge picture"> / <img src="http://katalog.we-online.de/media/images/eisos/AbsSESF_pf2.jpg" width="320"></a><p> / Details see: <a href="http://katalog.we-online.de/en/pbs/WE-SECF?">http://katalog.we-online.de/en/pbs/WE-SECF?</a><p> / </b> / </b>Updated  by  Dan Xu 2014-07-15<br> / </b>2014 (C) Wurth Elektronik
MANUFACTURER: Würth Elektronik eiSos GmbH; CREATED-BY: Christin Otto; COMPANY-URL: http://www.we-online.de; CREATED-DATE: MAR 2013; DATASHEET-URL: http://katalog.we-online.de/pbs/datasheet/331211503040.pdf
footprint WE-SECF_2140
pins: 1 P$1 (power)

## WE-SECF-2240
designator L?, comment <b> SMD EMI Contact Finger / <br> / <br> / <br><b> Characteristics / <br> / <br></b></b> Material: Copper Beryllium (CuBe) gold-plated (AU) / <br> / <br> Corrosion resistant / <br> / <br> Wear resistant / <br> / <br> High temperatures and mechanical weight have no influence on the excellent connection properties / <br> / <br> Reliable solderability / <br> / <br> Tape & reel packaging / <br> / <br> Perfectly suited for automated placement / <br> / <br> Different types and sizes available / <br> / <br> / <br><b> Applications / <br> / <br></b> Contact between PCB's ground and housing / <br> / <br> Low impedance RF connection between PCBs and/or PCB and metal case / <br> / <br> / </b><br><a href="<br><a href="http://katalog.we-online.de/media/images/eisos/AbsSESF_pf2.jpg" title="Enlarge picture"> / <img src="http://katalog.we-online.de/media/images/eisos/AbsSESF_pf2.jpg" width="320"></a><p> / Details see: <a href="http://katalog.we-online.de/en/pbs/WE-SECF?">http://katalog.we-online.de/en/pbs/WE-SECF?</a><p> / </b> / </b>Updated  by  Dan Xu 2014-07-15<br> / </b>2014 (C) Wurth Elektronik
MANUFACTURER: Würth Elektronik eiSos GmbH; CREATED-BY: Christin Otto; COMPANY-URL: http://www.we-online.de; CREATED-DATE: MAR 2013; DATASHEET-URL: http://katalog.we-online.de/pbs/datasheet/331221602040.pdf
footprint WE-SECF_2240
pins: 1 P$1 (power)

## WE-SECF_0135
designator L?, comment <b> SMD EMI Contact Finger / <br> / <br> / <br><b> Characteristics / <br> / <br></b></b> Material: Copper Beryllium (CuBe) gold-plated (AU) / <br> / <br> Corrosion resistant / <br> / <br> Wear resistant / <br> / <br> High temperatures and mechanical weight have no influence on the excellent connection properties / <br> / <br> Reliable solderability / <br> / <br> Tape & reel packaging / <br> / <br> Perfectly suited for automated placement / <br> / <br> Different types and sizes available / <br> / <br> / <br><b> Applications / <br> / <br></b> Contact between PCB's ground and housing / <br> / <br> Low impedance RF connection between PCBs and/or PCB and metal case / <br> / <br> / </b><br><a href="<br><a href="http://katalog.we-online.de/media/images/eisos/AbsSESF_pf2.jpg" title="Enlarge picture"> / <img src="http://katalog.we-online.de/media/images/eisos/AbsSESF_pf2.jpg" width="320"></a><p> / Details see: <a href="http://katalog.we-online.de/en/pbs/WE-SECF?">http://katalog.we-online.de/en/pbs/WE-SECF?</a><p> / </b> / </b>Updated  by  Dan Xu 2014-07-15<br> / </b>2014 (C) Wurth Elektronik
footprint WE-SECF_0135
pins: 1 P$1 (power)

## WE-SHC_36103205
designator S?, comment <b> Shielding Cabinet / <br> / <br> / <br> <b> Characteristics / <br> / <br></b></b> Tin plate in accordance with DIN EN 10202/10203 / <br> / <br> Shielding effectiveness up to 55 dB / <br> / <br> Two-part case consisting of a solderable grid frame (SMD/THT) and a removable cover / <br> / <br> / <br><b> Applications / <br> / <br></b> To prevent EMI radiation from PCB and to keep sensitivity low of: / <br> - RF output stages / <br> - RF input and amplifier stages; / <br> - Oscillators / <br> - EMC sensitive parts in plastic cases / <br> / <br> / <br> / </b><br><a href="<br><a href="http://katalog.we-online.de/media/images/eisos/AbsSHC_pf2.jpg" title="Enlarge picture"> / <img src="http://katalog.we-online.de/media/thumbs2/eisos/thb_AbsSHC_pf2.jpg" width="320"></a><p> / Details see: <a href="http://katalog.we-online.de/en/pbs/WE-SHC?m">http://katalog.we-online.de/en/pbs/WE-SHC?m</a><p> / </b> / </b>Updated  by  Dan Xu 2014-07-11<br> / </b>2014 (C) Wurth Elektronik
footprint WE-SHC_36103205
pins: 1 GND (power)

## WE-SHC_36103255
designator S?, comment <b> Shielding Cabinet / <br> / <br> / <br> <b> Characteristics / <br> / <br></b></b> Tin plate in accordance with DIN EN 10202/10203 / <br> / <br> Shielding effectiveness up to 55 dB / <br> / <br> Two-part case consisting of a solderable grid frame (SMD/THT) and a removable cover / <br> / <br> / <br><b> Applications / <br> / <br></b> To prevent EMI radiation from PCB and to keep sensitivity low of: / <br> - RF output stages / <br> - RF input and amplifier stages; / <br> - Oscillators / <br> - EMC sensitive parts in plastic cases / <br> / <br> / <br> / </b><br><a href="<br><a href="http://katalog.we-online.de/media/images/eisos/AbsSHC_pf2.jpg" title="Enlarge picture"> / <img src="http://katalog.we-online.de/media/thumbs2/eisos/thb_AbsSHC_pf2.jpg" width="320"></a><p> / Details see: <a href="http://katalog.we-online.de/en/pbs/WE-SHC?m">http://katalog.we-online.de/en/pbs/WE-SHC?m</a><p> / </b> / </b>Updated  by  Dan Xu 2014-07-11<br> / </b>2014 (C) Wurth Elektronik
footprint WE-SHC_36103255
pins: 1 GND (power)

## WE-SHC_36103305
designator S?, comment <b> Shielding Cabinet / <br> / <br> / <br> <b> Characteristics / <br> / <br></b></b> Tin plate in accordance with DIN EN 10202/10203 / <br> / <br> Shielding effectiveness up to 55 dB / <br> / <br> Two-part case consisting of a solderable grid frame (SMD/THT) and a removable cover / <br> / <br> / <br><b> Applications / <br> / <br></b> To prevent EMI radiation from PCB and to keep sensitivity low of: / <br> - RF output stages / <br> - RF input and amplifier stages; / <br> - Oscillators / <br> - EMC sensitive parts in plastic cases / <br> / <br> / <br> / </b><br><a href="<br><a href="http://katalog.we-online.de/media/images/eisos/AbsSHC_pf2.jpg" title="Enlarge picture"> / <img src="http://katalog.we-online.de/media/thumbs2/eisos/thb_AbsSHC_pf2.jpg" width="320"></a><p> / Details see: <a href="http://katalog.we-online.de/en/pbs/WE-SHC?m">http://katalog.we-online.de/en/pbs/WE-SHC?m</a><p> / </b> / </b>Updated  by  Dan Xu 2014-07-11<br> / </b>2014 (C) Wurth Elektronik
footprint WE-SHC_36103305
pins: 1 GND (power)

## WE-SHC_36103505
designator S?, comment <b> Shielding Cabinet / <br> / <br> / <br> <b> Characteristics / <br> / <br></b></b> Tin plate in accordance with DIN EN 10202/10203 / <br> / <br> Shielding effectiveness up to 55 dB / <br> / <br> Two-part case consisting of a solderable grid frame (SMD/THT) and a removable cover / <br> / <br> / <br><b> Applications / <br> / <br></b> To prevent EMI radiation from PCB and to keep sensitivity low of: / <br> - RF output stages / <br> - RF input and amplifier stages; / <br> - Oscillators / <br> - EMC sensitive parts in plastic cases / <br> / <br> / <br> / </b><br><a href="<br><a href="http://katalog.we-online.de/media/images/eisos/AbsSHC_pf2.jpg" title="Enlarge picture"> / <img src="http://katalog.we-online.de/media/thumbs2/eisos/thb_AbsSHC_pf2.jpg" width="320"></a><p> / Details see: <a href="http://katalog.we-online.de/en/pbs/WE-SHC?m">http://katalog.we-online.de/en/pbs/WE-SHC?m</a><p> / </b> / </b>Updated  by  Dan Xu 2014-07-11<br> / </b>2014 (C) Wurth Elektronik
footprint WE-SHC_36103505
pins: 1 GND (power)

## WE-SHC_36103605
designator S?, comment <b> Shielding Cabinet / <br> / <br> / <br> <b> Characteristics / <br> / <br></b></b> Tin plate in accordance with DIN EN 10202/10203 / <br> / <br> Shielding effectiveness up to 55 dB / <br> / <br> Two-part case consisting of a solderable grid frame (SMD/THT) and a removable cover / <br> / <br> / <br><b> Applications / <br> / <br></b> To prevent EMI radiation from PCB and to keep sensitivity low of: / <br> - RF output stages / <br> - RF input and amplifier stages; / <br> - Oscillators / <br> - EMC sensitive parts in plastic cases / <br> / <br> / <br> / </b><br><a href="<br><a href="http://katalog.we-online.de/media/images/eisos/AbsSHC_pf2.jpg" title="Enlarge picture"> / <img src="http://katalog.we-online.de/media/thumbs2/eisos/thb_AbsSHC_pf2.jpg" width="320"></a><p> / Details see: <a href="http://katalog.we-online.de/en/pbs/WE-SHC?m">http://katalog.we-online.de/en/pbs/WE-SHC?m</a><p> / </b> / </b>Updated  by  Dan Xu 2014-07-11<br> / </b>2014 (C) Wurth Elektronik
footprint WE-SHC_36103605
pins: 1 GND (power)